# Altium footprint library 总库.PcbLib: 264 footprints (part 14 of 17)
Each footprint in its own frame and in the unit in brackets; x right, y up, seen from the top. Pads: shape width x height; smd on the part's side, far side on the other; paste and mask are expansions set on the pad; w line width, h text height; cw(c..) or ccw(c..) is an arc to the next point about the centre after c.
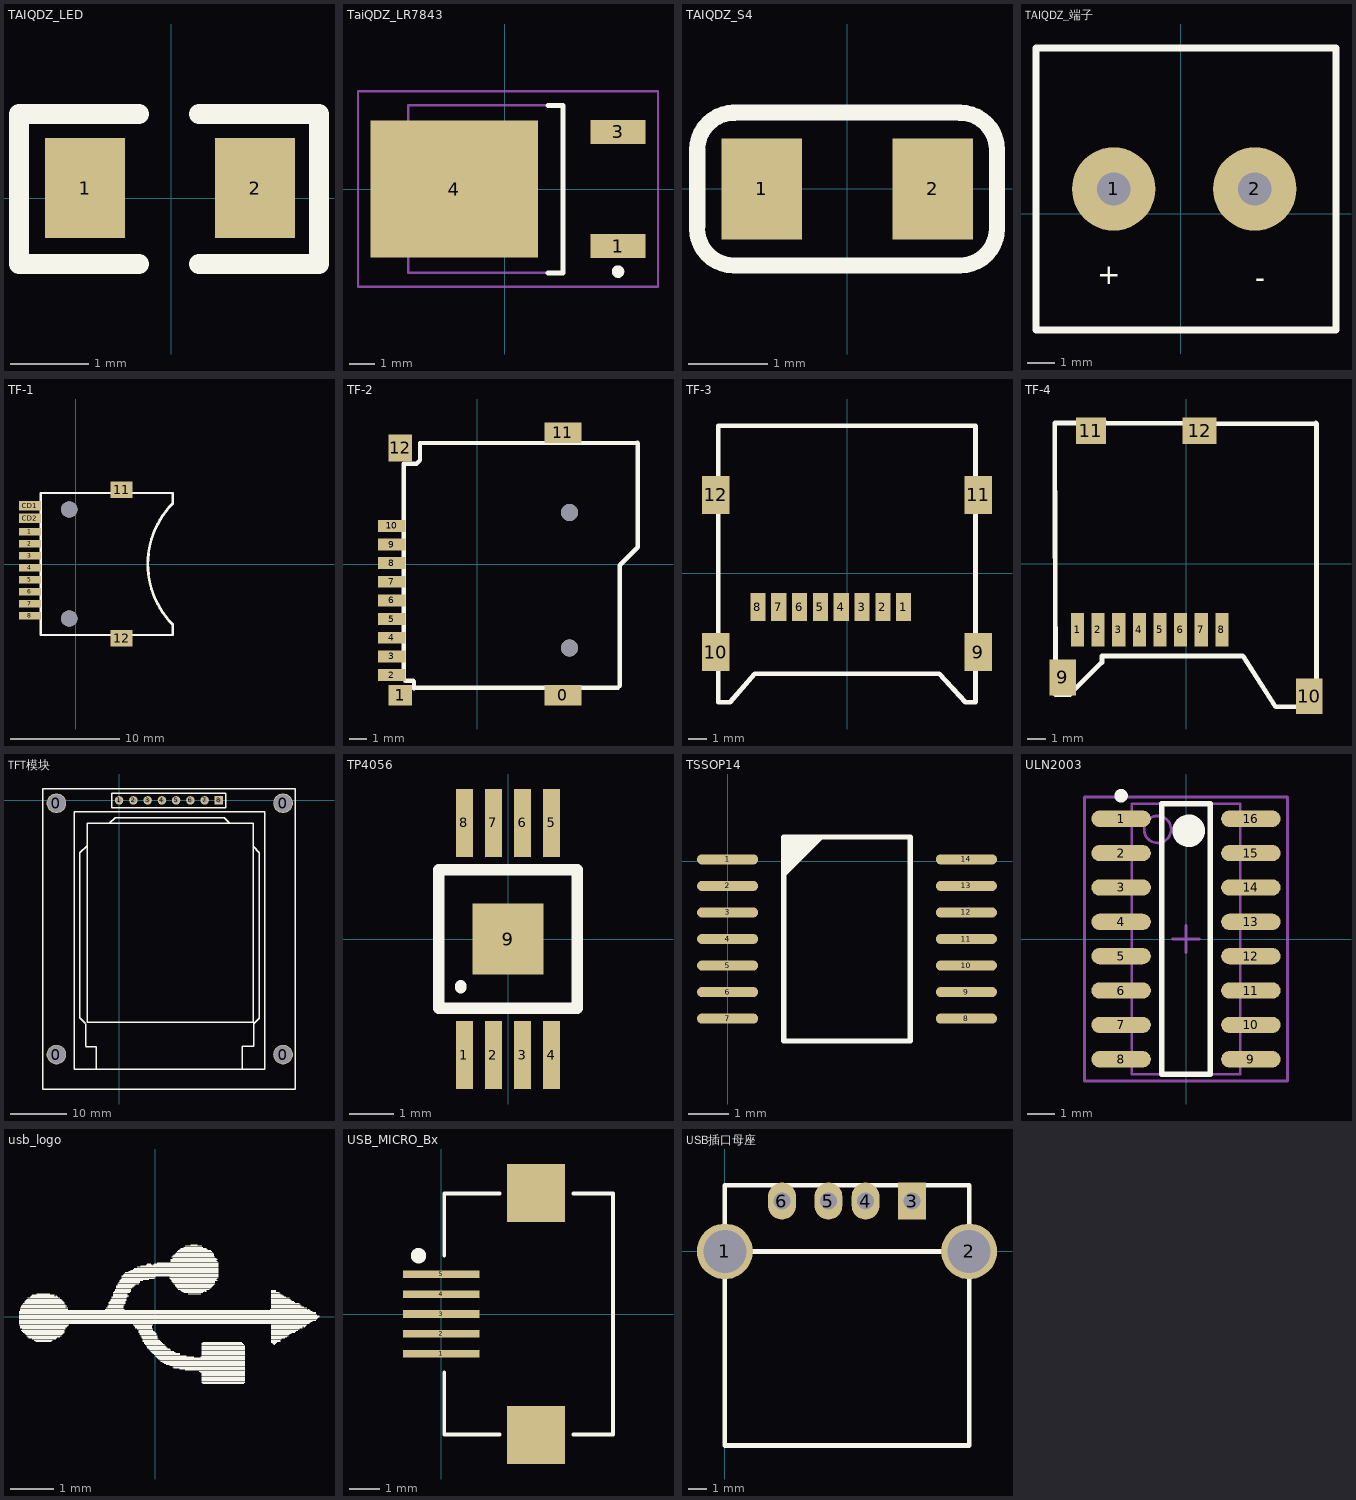
[diagram p13: the footprints below, top view; thin cyan lines are the x and y axes]

## TAIQDZ_LED [mil]
pads (2):
  rect 40x50 smd: 1(-43.06,5) 2(41.94,5)
Top Overlay:
  lines w10: -16.06,-33 -76.06,-33 -76.06,42 -16.06,42 ; 13.94,-33 73.94,-33 73.94,42 13.94,42
3D body: height 43.31, standoff 0, extent -37.83,-19.21 41.7,30

## TaiQDZ_LR7843 [mm]
pads (3):
  rect 2.2x0.95 smd: 1(4.527,-2.28) 3(4.527,2.28)
  rect 6.7x5.5 smd: 4(-2.023,0)
Top Overlay:
  circle w0.25: c4.527,-3.305 r0.125
  lines w0.2: 1.727,-3.35 2.327,-3.35 2.327,3.35 1.727,3.35
Mechanical 13:
  lines w0.1: -3.873,-3.35 -3.873,3.35 2.327,3.35 2.327,-3.35 -3.873,-3.35
Mechanical 15:
  lines w0.1: -0.373,0 0.627,0 ; 0.127,-0.5 0.127,0.5 ; -5.873,-3.9 -5.873,3.9 6.127,3.9 6.127,-3.9 -5.873,-3.9
3D body: height 2.39, standoff -0.02, extent -4.911,-3.27 5.027,3.27

## TAIQDZ_S4 [mil]
pads (2):
  rect 40x50 smd: 1(-42.5,0) 2(42.5,0)
Top Overlay:
  lines w8: -74.61,-19.59 ccw(c-56.2,-19.59) -56.2,-38 ; -74.5,-18.5 -74.5,18.5 ; -74.5,19.5 cw(c-56.09,19.5) -56.09,37.91 ; -56.62,38 55.59,38 ; -55.2,-38 55.61,-38 ; 56.09,-38 ccw(c56.09,-19.59) 74.5,-19.59 ; 56.09,37.91 cw(c56.09,19.5) 74.5,19.5 ; 74.5,-18.59 74.5,18.5
3D body: height 30.39, standoff -0.39, extent -39.35,-24.61 39.39,24.61

## TAIQDZ_端子 [mm]
pads (2):
  round 3 hole 1.2: 1(-2.413,0.889) 2(2.667,0.889)
Top Overlay:
  lines w0.254: -5.207,-4.191 5.588,-4.191 5.588,5.969 -5.207,5.969 -5.207,-4.191
  text "+" at -2.159,-2.794 h1.27
  text "-" at 3.048,-2.921 h1.27
3D body: height 10, standoff -3.5, extent -4.984,-3.048 5.746,5.052

## TF-1 [mm]
pads (14):
  rect 2x0.7 smd: 1(-4.2,2.95) 2(-4.2,1.85) 3(-4.2,0.75) 4(-4.2,-0.35) 5(-4.2,-1.45) 6(-4.2,-2.55) 7(-4.2,-3.65) 8(-4.2,-4.75)
  rect 2x1.5 smd: 11(4.2,6.82) 12(4.2,-6.82)
  rect 2x0.85 smd: CD1(-4.2,5.35) CD2(-4.2,4.2)
  round 1.5 hole 1.5 unplated: ""(-0.6,-5)
  round 1.5 hole 1.5: ""(-0.6,5)
Top Overlay:
  lines w0.2: 8.9,-5.55 8.9,-6.515 -3.2,-6.515 -3.2,6.515 8.9,6.515 8.9,5.55
  lines w0.254: 8.9,-5.55 cw(c14.45,0) 8.9,5.55

## TF-2 [mm]
pads (13):
  rect 2.2x1.2 smd: 0(5.05,-7.75) 11(5.05,7.75)
  rect 1.4x1.2 smd: 1(-4.55,-7.75)
  rect 1.6x0.7 smd: 2(-5.05,-6.55) 3(-5.05,-5.45) 4(-5.05,-4.35) 5(-5.05,-3.25) 6(-5.05,-2.15) 7(-5.05,-1.05) 8(-5.05,0.05) 9(-5.05,1.15) 10(-5.05,2.25)
  rect 1.4x1.6 smd: 12(-4.55,6.85)
via 5.45,-4.95 diameter 1 hole 1
via 5.45,3.05 diameter 1 hole 1
Top Layer:
  lines w0.254: -3.738,-7.344 -3.688,-7.293
Top Overlay:
  lines w0.254: -3.738,-7.344 -3.738,-6.937 -3.789,-6.886 -4.246,-6.886 -4.348,-6.785 -4.348,5.915 -3.586,5.915 -3.383,6.118 -3.383,7.134 9.45,7.15 ; -3.688,-7.293 8.301,-7.293 8.403,-7.191 8.403,-0.079 9.47,0.988 9.47,7.13

## TF-3 [mm]
pads (12):
  rect 0.8x1.5 smd: 1(2.993,-1.772) 2(1.893,-1.772) 3(0.793,-1.772) 4(-0.307,-1.772) 5(-1.407,-1.772) 6(-2.507,-1.772) 7(-3.607,-1.772) 8(-4.707,-1.772)
  rect 1.45x2 smd: 9(6.925,-4.15) 10(-6.925,-4.15) 11(6.925,4.15) 12(-6.925,4.15)
Top Overlay:
  lines w0.254: -6.805,-6.8 -6.182,-6.8 -4.875,-5.3 4.865,-5.3 6.264,-6.8 6.795,-6.8 6.795,7.8 -6.805,7.8 -6.805,-6.8

## TF-4 [mm]
pads (12):
  rect 0.7x1.8 smd: 1(-5.785,-3.525) 2(-4.685,-3.525) 3(-3.585,-3.525) 4(-2.485,-3.525) 5(-1.385,-3.525) 6(-0.285,-3.525) 7(0.815,-3.525) 8(1.915,-3.525)
  rect 1.4x1.9 smd: 9(-6.575,-6.075) 10(6.575,-7.075)
  rect 1.6x1.4 smd: 11(-5.075,7.075)
  rect 1.8x1.4 smd: 12(0.725,7.075)
Top Overlay:
  lines w0.254: -4.261,7.499 -7.004,7.499 ; 6.864,7.448 -7.004,7.499 ; 6.915,7.499 6.966,7.448 6.966,-7.64 ; 7.017,-7.589 6.966,-7.64 ; -7.004,7.499 -6.953,-6.979 -6.191,-6.979 -4.485,-5.273 -4.485,-4.925 2.935,-4.925 3.032,-4.925 4.781,-7.64 6.966,-7.64

## TFT模块 [mm]
pads (12):
  round 3.5 hole 3.2: 0(-11.176,-45.308) 0(-11.176,-0.508) 0(29.214,-45.308) 0(29.214,-0.508)
  round 1.5 hole 0.9: 1(0,0) 2(2.54,0) 3(5.08,0) 4(7.62,0) 5(10.16,0) 6(12.7,0) 7(15.24,0)
  rect 1.5x1.5 hole 0.9: 8(17.78,0)
Top Overlay:
  lines w0.254: -7.014,-38.755 -6.018,-39.751 ; -7.001,-38.783 -7.001,-27.305 -7.001,-9.35 -5.715,-8.064 ; -5.969,-43.815 -5.969,-39.815 ; -5.905,-43.879 -4.064,-43.879 -4.064,-47.879 ; 21.971,-47.815 21.971,-43.815 24.003,-43.815 24.003,-39.815 ; 24.003,-39.829 24.999,-38.833 24.999,-21.59 24.999,-9.314 23.876,-8.191 ; -5.715,-8.064 -5.715,-4.064 ; -5.715,-8.064 -5.715,-39.497 23.876,-39.497 23.876,-8.191 ; -5.715,-4.064 -1.715,-4.064 -0.699,-3.048 18.733,-3.048 19.749,-4.064 23.876,-4.064 ; -5.715,-4.064 23.876,-4.064 ; 23.876,-8.191 23.876,-4.064 ; -13.589,-51.438 31.371,-51.438 31.371,2.032 -13.589,2.032 -13.589,-51.438 ; -8.001,-47.879 -8.001,-2.049 25.999,-2.049 25.999,-47.879 -8.001,-47.879 ; -1.27,-1.27 19.05,-1.27 19.05,1.27 -1.27,1.27 -1.27,-1.27
3D body: height 6.48, standoff 5.08, extent -5.714,-39.496 23.875,-4.065
3D body: height 6.48, standoff 5.08, extent 6.993,-46.101 11.041,-42.045
3D body: height 6.35, standoff 5.08, extent -8.128,-48.006 26.126,-1.922
3D body: height 5.08, standoff 4.32, extent -13.716,-51.565 31.498,2.159
3D body: height 6.48, standoff 5.08, extent -1.269,-1.269 19.049,1.269

## TP4056 [mm] "Li-Battery Changer"
pads (9):
  rect 0.38x1.524 smd: 1(-0.975,-2.6) 2(-0.325,-2.6) 3(0.325,-2.6) 4(0.975,-2.6) 5(0.975,2.6) 6(0.325,2.6) 7(-0.325,2.6) 8(-0.975,2.6)
  rect 1.6x1.6 smd: 9(0,0)
Top Overlay:
  lines w0.254: -1.06,-1.09 -1.06,-1.05 ; -1.55,-1.55 -1.55,1.55 1.55,1.55 1.55,-1.55 -1.55,-1.55

## TSSOP14 [mm]
pads (14):
  oval 1.5x0.25 smd paste-1: 1(-0.004,0.045) 2(-0.004,-0.605) 3(-0.004,-1.255) 4(-0.004,-1.905) 5(-0.004,-2.555) 6(-0.004,-3.205) 7(-0.004,-3.855) 8(5.846,-3.855) 9(5.846,-3.205) 10(5.846,-2.555) 11(5.846,-1.905) 12(5.846,-1.255) 13(5.846,-0.605) 14(5.846,0.045)
Top Overlay:
  region: 1.371,0.595 2.371,0.595 1.371,-0.405
  lines w0.127: 1.371,-4.405 4.471,-4.405 4.471,0.595 1.371,0.595 1.371,-4.405
3D body: height 1.05, standoff 0, extent -0.284,-4.405 6.126,0.595

## ULN2003 [mm] "SOIC, 16-Leads, Body 10.0x4.0mm (max), Pitch 1.27mm, IPC Medium Density"
height 1.748
pads (16):
  oval 2.2x0.6 smd: 1(-2.4,4.445) 2(-2.4,3.175) 3(-2.4,1.905) 4(-2.4,0.635) 5(-2.4,-0.635) 6(-2.4,-1.905) 7(-2.4,-3.175) 8(-2.4,-4.445) 9(2.4,-4.445) 10(2.4,-3.175) 11(2.4,-1.905) 12(2.4,-0.635) 13(2.4,0.635) 14(2.4,1.905) 15(2.4,3.175) 16(2.4,4.445)
Top Overlay:
  circle w0.25: c-2.4,5.295 r0.125
  circle w0.6: c0.1,4 r0.3
  lines w0.2: -0.9,-5 -0.9,5 0.9,5 0.9,-5 -0.9,-5
Mechanical 13:
  circle w0.1: c-1.05,4.05 r0.5
  lines w0.1: -2,-5 -2,5 2,5 2,-5 -2,-5
Mechanical 15:
  lines w0.1: -0.5,0 0.5,0 ; 0,-0.5 0,0.5 ; -3.75,-5.25 -3.75,5.25 3.75,5.25 3.75,-5.25 -3.75,-5.25
3D body: height 1.75, standoff 0.19, extent -2,-5 2,5

## USB-gongtou [mm]

## usb_logo [mm]
Top Overlay:
  drawing of 230 lines, arcs and shapes, not listed

## USB_MICRO_Bx [mm] "Connector; USB2.0, Type A, SM; 5 Position; Right Angle"
height 3.9
pads (7):
  rect 2.5x0.25 smd: 1(0,-1.3) 2(0,-0.65) 3(0,0) 4(0,0.65) 5(0,1.3)
  rect 1.9x1.9 smd: ""(3.095,-3.95) ""(3.095,3.95)
Top Overlay:
  circle w0.25: c-0.748,1.905 r0.125
  lines w0.127: 0.092,-3.937 1.9,-3.937 ; 0.092,-3.9 0.092,-1.905 ; 0.092,1.905 0.092,3.9 ; 0.092,3.937 1.9,3.937 ; 4.314,-3.937 5.6,-3.937 ; 4.314,3.937 5.6,3.937 ; 5.6,-3.9 5.6,3.9
3D body: height 2.71, standoff -0.23, extent 0.242,-4.003 5.672,3.977

## USB插口母座 [mm]
pads (6):
  round 3 hole 2.3: 1(0,0) 2(13.14,0)
  rect 1.5x2 hole 0.92: 3(10.07,2.71)
  oval 1.5x2 hole 0.92: 4(7.57,2.71) 5(5.57,2.71) 6(3.07,2.71)
Top Overlay:
  lines w0.254: 0,0 13.14,0 ; 0,-10.444 0,3.556 13.14,3.556 13.14,-10.444 0,-10.444